# Altium schematic symbol library jlcpcb_2025_04_capacitors_extended_1206.schlib: 2503 symbols (part 11 of 14) (continued)
## GRM31CR70J226KE19L
designator C?  Capacitance: 22uF  (hidden comment: *)
Capacitor, Ceramic (MLCC), 22uF, ±10%, 6.3V, X7R, ±10%, SMD 1206; Manufacturer: Murata Electronics; Manufacturer Part Number: GRM31CR70J226KE19L; Package Size: 1206; JLCPCB Basic Part: No; JLCPCB Part Number: C408152; Supplier 1: LCSC; Category: Capacitors - MLCC; Supplier Part Number 1: C408152; Tolerance: ±10%; Voltage Rating: 6.3V; Temperature Coefficient: X7R; RoHS: Yes; ComponentLink1Description: Datasheet; ComponentLink1URL: https://wmsc.lcsc.com/wmsc/upload/file/pdf/v2/lcsc/2304140030_Murata-Electronics-GRM31CR70J226KE19L_C408152.pdf; ComponentLink2Description: JLCPCB Part URL; ComponentLink2URL: https://jlcpcb.com/partdetail/C408152; ComponentLink3Description: LCSC Part URL; ComponentLink3URL: https://lcsc.com/product-detail/Multilayer-Ceramic-Capacitors-MLCC---SMD-SMT_Murata-Electronics-Murata-Electronics-GRM31CR70J226KE19L_C408152.html
footprint CAP-1206 (1206 (3216M) Capacitor)
pins: 1, 2

## GRM31CR70J226ME19L
designator C?  Capacitance: 22uF  (hidden comment: *)
Capacitor, Ceramic (MLCC), 22uF, ±20%, 6.3V, X7R, ±20%, SMD 1206; Manufacturer: Murata Electronics; Manufacturer Part Number: GRM31CR70J226ME19L; Package Size: 1206; JLCPCB Basic Part: No; JLCPCB Part Number: C703095; Supplier 1: LCSC; Category: Capacitors - MLCC; Supplier Part Number 1: C703095; Tolerance: ±20%; Voltage Rating: 6.3V; Temperature Coefficient: X7R; RoHS: Yes; ComponentLink1Description: Datasheet; ComponentLink1URL: https://wmsc.lcsc.com/wmsc/upload/file/pdf/v2/lcsc/2304140030_Murata-Electronics-GRM31CR70J226ME19L_C703095.pdf; ComponentLink2Description: JLCPCB Part URL; ComponentLink2URL: https://jlcpcb.com/partdetail/C703095; ComponentLink3Description: LCSC Part URL; ComponentLink3URL: https://lcsc.com/product-detail/Multilayer-Ceramic-Capacitors-MLCC---SMD-SMT_Murata-Electronics-Murata-Electronics-GRM31CR70J226ME19L_C703095.html
footprint CAP-1206 (1206 (3216M) Capacitor)
pins: 1, 2

## GRM31CR71A106KA01L
designator C?  Capacitance: 10uF  (hidden comment: *)
Capacitor, Ceramic (MLCC), 10uF, ±10%, 10V, X7R, ±10%, SMD 1206; Manufacturer: Murata Electronics; Manufacturer Part Number: GRM31CR71A106KA01L; Package Size: 1206; JLCPCB Basic Part: No; JLCPCB Part Number: C97953; Supplier 1: LCSC; Category: Capacitors - MLCC; Supplier Part Number 1: C97953; Tolerance: ±10%; Voltage Rating: 10V; Temperature Coefficient: X7R; RoHS: Yes; ComponentLink1Description: Datasheet; ComponentLink1URL: https://wmsc.lcsc.com/wmsc/upload/file/pdf/v2/lcsc/2304140030_Murata-Electronics-GRM31CR71A106KA01L_C97953.pdf; ComponentLink2Description: JLCPCB Part URL; ComponentLink2URL: https://jlcpcb.com/partdetail/C97953; ComponentLink3Description: LCSC Part URL; ComponentLink3URL: https://lcsc.com/product-detail/Multilayer-Ceramic-Capacitors-MLCC---SMD-SMT_Murata-Electronics-Murata-Electronics-GRM31CR71A106KA01L_C97953.html
footprint CAP-1206 (1206 (3216M) Capacitor)
pins: 1, 2

## GRM31CR71A226KE15L
designator C?  Capacitance: 22uF  (hidden comment: *)
Capacitor, Ceramic (MLCC), 22uF, ±10%, 10V, X7R, ±10%, SMD 1206; Manufacturer: Murata Electronics; Manufacturer Part Number: GRM31CR71A226KE15L; Package Size: 1206; JLCPCB Basic Part: No; JLCPCB Part Number: C91604; Supplier 1: LCSC; Category: Capacitors - MLCC; Supplier Part Number 1: C91604; Tolerance: ±10%; Voltage Rating: 10V; Temperature Coefficient: X7R; RoHS: Yes; ComponentLink1Description: Datasheet; ComponentLink1URL: https://wmsc.lcsc.com/wmsc/upload/file/pdf/v2/lcsc/2304140030_Murata-Electronics-GRM31CR71A226KE15L_C91604.pdf; ComponentLink2Description: JLCPCB Part URL; ComponentLink2URL: https://jlcpcb.com/partdetail/C91604; ComponentLink3Description: LCSC Part URL; ComponentLink3URL: https://lcsc.com/product-detail/Multilayer-Ceramic-Capacitors-MLCC---SMD-SMT_Murata-Electronics-Murata-Electronics-GRM31CR71A226KE15L_C91604.html
footprint CAP-1206 (1206 (3216M) Capacitor)
pins: 1, 2

## GRM31CR71A226ME15L
designator C?  Capacitance: 22uF  (hidden comment: *)
Capacitor, Ceramic (MLCC), 22uF, ±20%, 10V, X7R, ±20%, SMD 1206; Manufacturer: Murata Electronics; Manufacturer Part Number: GRM31CR71A226ME15L; Package Size: 1206; JLCPCB Basic Part: No; JLCPCB Part Number: C162492; Supplier 1: LCSC; Category: Capacitors - MLCC; Supplier Part Number 1: C162492; Tolerance: ±20%; Voltage Rating: 10V; Temperature Coefficient: X7R; RoHS: Yes; ComponentLink1Description: Datasheet; ComponentLink1URL: https://wmsc.lcsc.com/wmsc/upload/file/pdf/v2/lcsc/2304140030_Murata-Electronics-GRM31CR71A226ME15L_C162492.pdf; ComponentLink2Description: JLCPCB Part URL; ComponentLink2URL: https://jlcpcb.com/partdetail/C162492; ComponentLink3Description: LCSC Part URL; ComponentLink3URL: https://lcsc.com/product-detail/Multilayer-Ceramic-Capacitors-MLCC---SMD-SMT_Murata-Electronics-Murata-Electronics-GRM31CR71A226ME15L_C162492.html
footprint CAP-1206 (1206 (3216M) Capacitor)
pins: 1, 2

## GRM31CR71C106KA12L
designator C?  Capacitance: 10uF  (hidden comment: *)
Capacitor, Ceramic (MLCC), 10uF, ±10%, 16V, X7R, ±10%, SMD 1206; Manufacturer: Murata Electronics; Manufacturer Part Number: GRM31CR71C106KA12L; Package Size: 1206; JLCPCB Basic Part: No; JLCPCB Part Number: C97954; Supplier 1: LCSC; Category: Capacitors - MLCC; Supplier Part Number 1: C97954; Tolerance: ±10%; Voltage Rating: 16V; Temperature Coefficient: X7R; RoHS: Yes; ComponentLink1Description: Datasheet; ComponentLink1URL: https://wmsc.lcsc.com/wmsc/upload/file/pdf/v2/lcsc/1810201308_Murata-Electronics-GRM31CR71C106KA12L_C97954.pdf; ComponentLink2Description: JLCPCB Part URL; ComponentLink2URL: https://jlcpcb.com/partdetail/C97954; ComponentLink3Description: LCSC Part URL; ComponentLink3URL: https://lcsc.com/product-detail/Multilayer-Ceramic-Capacitors-MLCC---SMD-SMT_Murata-Electronics-Murata-Electronics-GRM31CR71C106KA12L_C97954.html
footprint CAP-1206 (1206 (3216M) Capacitor)
pins: 1, 2

## GRM31CR71C475KA01L
designator C?  Capacitance: 4.7uF  (hidden comment: *)
Capacitor, Ceramic (MLCC), 4.7uF, ±10%, ±10%, SMD 1206; Manufacturer: Murata Electronics; Manufacturer Part Number: GRM31CR71C475KA01L; Package Size: 1206; JLCPCB Basic Part: No; JLCPCB Part Number: C97955; Supplier 1: LCSC; Category: Capacitors - MLCC; Supplier Part Number 1: C97955; Tolerance: ±10%; RoHS: Yes; ComponentLink1Description: Datasheet; ComponentLink1URL: https://wmsc.lcsc.com/wmsc/upload/file/pdf/v2/lcsc/2011191404_Murata-Electronics-GRM31CR71C475KA01L_C97955.pdf; ComponentLink2Description: JLCPCB Part URL; ComponentLink2URL: https://jlcpcb.com/partdetail/C97955; ComponentLink3Description: LCSC Part URL; ComponentLink3URL: https://lcsc.com/product-detail/Multilayer-Ceramic-Capacitors-MLCC---SMD-SMT_Murata-Electronics-Murata-Electronics-GRM31CR71C475KA01L_C97955.html
footprint CAP-1206 (1206 (3216M) Capacitor)
pins: 1, 2

## GRM31CR71E106KA12K
designator C?  Capacitance: 10uF  (hidden comment: *)
Capacitor, Ceramic (MLCC), 10uF, ±10%, 25V, X7R, ±10%, SMD 1206; Manufacturer: Murata Electronics; Manufacturer Part Number: GRM31CR71E106KA12K; Package Size: 1206; JLCPCB Basic Part: No; JLCPCB Part Number: C882506; Supplier 1: LCSC; Category: Capacitors - MLCC; Supplier Part Number 1: C882506; Tolerance: ±10%; Voltage Rating: 25V; Temperature Coefficient: X7R; RoHS: Yes; ComponentLink1Description: Datasheet; ComponentLink1URL: https://wmsc.lcsc.com/wmsc/upload/file/pdf/v2/lcsc/2201242130_Murata-Electronics-GRM31CR71E106KA12K_C882506.pdf; ComponentLink2Description: JLCPCB Part URL; ComponentLink2URL: https://jlcpcb.com/partdetail/C882506; ComponentLink3Description: LCSC Part URL; ComponentLink3URL: https://lcsc.com/product-detail/Multilayer-Ceramic-Capacitors-MLCC---SMD-SMT_Murata-Electronics-Murata-Electronics-GRM31CR71E106KA12K_C882506.html
footprint CAP-1206 (1206 (3216M) Capacitor)
pins: 1, 2

## GRM31CR71E106KA12L
designator C?  Capacitance: 10uF  (hidden comment: *)
Capacitor, Ceramic (MLCC), 10uF, ±10%, 25V, X7R, ±10%, SMD 1206; Manufacturer: Murata Electronics; Manufacturer Part Number: GRM31CR71E106KA12L; Package Size: 1206; JLCPCB Basic Part: No; JLCPCB Part Number: C77093; Supplier 1: LCSC; Category: Capacitors - MLCC; Supplier Part Number 1: C77093; Tolerance: ±10%; Voltage Rating: 25V; Temperature Coefficient: X7R; RoHS: Yes; ComponentLink1Description: Datasheet; ComponentLink1URL: https://wmsc.lcsc.com/wmsc/upload/file/pdf/v2/lcsc/2304140030_Murata-Electronics-GRM31CR71E106KA12L_C77093.pdf; ComponentLink2Description: JLCPCB Part URL; ComponentLink2URL: https://jlcpcb.com/partdetail/C77093; ComponentLink3Description: LCSC Part URL; ComponentLink3URL: https://lcsc.com/product-detail/Multilayer-Ceramic-Capacitors-MLCC---SMD-SMT_Murata-Electronics-Murata-Electronics-GRM31CR71E106KA12L_C77093.html
footprint CAP-1206 (1206 (3216M) Capacitor)
pins: 1, 2

## GRM31CR71E106KA41L
designator C?  Capacitance: 10uF  (hidden comment: *)
Capacitor, Ceramic (MLCC), 10uF, ±10%, 25V, X7R, ±10%, SMD 1206; Manufacturer: Murata Electronics; Manufacturer Part Number: GRM31CR71E106KA41L; Package Size: 1206; JLCPCB Basic Part: No; JLCPCB Part Number: C469549; Supplier 1: LCSC; Category: Capacitors - MLCC; Supplier Part Number 1: C469549; Tolerance: ±10%; Voltage Rating: 25V; Temperature Coefficient: X7R; RoHS: Yes; ComponentLink1Description: Datasheet; ComponentLink1URL: https://wmsc.lcsc.com/wmsc/upload/file/pdf/v2/lcsc/2304140030_Murata-Electronics-GRM31CR71E106KA41L_C469549.pdf; ComponentLink2Description: JLCPCB Part URL; ComponentLink2URL: https://jlcpcb.com/partdetail/C469549; ComponentLink3Description: LCSC Part URL; ComponentLink3URL: https://lcsc.com/product-detail/Multilayer-Ceramic-Capacitors-MLCC---SMD-SMT_Murata-Electronics-Murata-Electronics-GRM31CR71E106KA41L_C469549.html
footprint CAP-1206 (1206 (3216M) Capacitor)
pins: 1, 2

## GRM31CR71E106MA12L
designator C?  Capacitance: 10uF  (hidden comment: *)
Capacitor, Ceramic (MLCC), 10uF, ±20%, 25V, X7R, ±20%, SMD 1206; Manufacturer: Murata Electronics; Manufacturer Part Number: GRM31CR71E106MA12L; Package Size: 1206; JLCPCB Basic Part: No; JLCPCB Part Number: C440205; Supplier 1: LCSC; Category: Capacitors - MLCC; Supplier Part Number 1: C440205; Tolerance: ±20%; Voltage Rating: 25V; Temperature Coefficient: X7R; RoHS: Yes; ComponentLink1Description: Datasheet; ComponentLink1URL: https://wmsc.lcsc.com/wmsc/upload/file/pdf/v2/lcsc/2304140030_Murata-Electronics-GRM31CR71E106MA12L_C440205.pdf; ComponentLink2Description: JLCPCB Part URL; ComponentLink2URL: https://jlcpcb.com/partdetail/C440205; ComponentLink3Description: LCSC Part URL; ComponentLink3URL: https://lcsc.com/product-detail/Multilayer-Ceramic-Capacitors-MLCC---SMD-SMT_Murata-Electronics-Murata-Electronics-GRM31CR71E106MA12L_C440205.html
footprint CAP-1206 (1206 (3216M) Capacitor)
pins: 1, 2

## GRM31CR71E335KA88L
designator C?  Capacitance: 3.3uF  (hidden comment: *)
Capacitor, Ceramic (MLCC), 3.3uF, ±10%, 25V, X7R, ±10%, SMD 1206; Manufacturer: Murata Electronics; Manufacturer Part Number: GRM31CR71E335KA88L; Package Size: 1206; JLCPCB Basic Part: No; JLCPCB Part Number: C668366; Supplier 1: LCSC; Category: Capacitors - MLCC; Supplier Part Number 1: C668366; Tolerance: ±10%; Voltage Rating: 25V; Temperature Coefficient: X7R; RoHS: Yes; ComponentLink1Description: Datasheet; ComponentLink1URL: https://wmsc.lcsc.com/wmsc/upload/file/pdf/v2/lcsc/2308111643_Murata-Electronics-GRM31CR71E335KA88L_C668366.pdf; ComponentLink2Description: JLCPCB Part URL; ComponentLink2URL: https://jlcpcb.com/partdetail/C668366; ComponentLink3Description: LCSC Part URL; ComponentLink3URL: https://lcsc.com/product-detail/Multilayer-Ceramic-Capacitors-MLCC---SMD-SMT_Murata-Electronics-Murata-Electronics-GRM31CR71E335KA88L_C668366.html
footprint CAP-1206 (1206 (3216M) Capacitor)
pins: 1, 2

## GRM31CR71E475KA88L
designator C?  Capacitance: 4.7uF  (hidden comment: *)
Capacitor, Ceramic (MLCC), 4.7uF, ±10%, 25V, X7R, ±10%, SMD 1206; Manufacturer: Murata Electronics; Manufacturer Part Number: GRM31CR71E475KA88L; Package Size: 1206; JLCPCB Basic Part: No; JLCPCB Part Number: C77094; Supplier 1: LCSC; Category: Capacitors - MLCC; Supplier Part Number 1: C77094; Tolerance: ±10%; Voltage Rating: 25V; Temperature Coefficient: X7R; RoHS: Yes; ComponentLink1Description: Datasheet; ComponentLink1URL: https://wmsc.lcsc.com/wmsc/upload/file/pdf/v2/lcsc/2304140030_Murata-Electronics-GRM31CR71E475KA88L_C77094.pdf; ComponentLink2Description: JLCPCB Part URL; ComponentLink2URL: https://jlcpcb.com/partdetail/C77094; ComponentLink3Description: LCSC Part URL; ComponentLink3URL: https://lcsc.com/product-detail/Multilayer-Ceramic-Capacitors-MLCC---SMD-SMT_Murata-Electronics-Murata-Electronics-GRM31CR71E475KA88L_C77094.html
footprint CAP-1206 (1206 (3216M) Capacitor)
pins: 1, 2

## GRM31CR71H225KA88L
designator C?  Capacitance: 2.2uF  (hidden comment: *)
Capacitor, Ceramic (MLCC), 2.2uF, ±10%, 50V, X7R, ±10%, SMD 1206; Manufacturer: Murata Electronics; Manufacturer Part Number: GRM31CR71H225KA88L; Package Size: 1206; JLCPCB Basic Part: No; JLCPCB Part Number: C77095; Supplier 1: LCSC; Category: Capacitors - MLCC; Supplier Part Number 1: C77095; Tolerance: ±10%; Voltage Rating: 50V; Temperature Coefficient: X7R; RoHS: Yes; ComponentLink1Description: Datasheet; ComponentLink1URL: https://wmsc.lcsc.com/wmsc/upload/file/pdf/v2/lcsc/2304140030_Murata-Electronics-GRM31CR71H225KA88L_C77095.pdf; ComponentLink2Description: JLCPCB Part URL; ComponentLink2URL: https://jlcpcb.com/partdetail/C77095; ComponentLink3Description: LCSC Part URL; ComponentLink3URL: https://lcsc.com/product-detail/Multilayer-Ceramic-Capacitors-MLCC---SMD-SMT_Murata-Electronics-Murata-Electronics-GRM31CR71H225KA88L_C77095.html
footprint CAP-1206 (1206 (3216M) Capacitor)
pins: 1, 2

## GRM31CR71H475KA12L
designator C?  Capacitance: 4.7uF  (hidden comment: *)
Capacitor, Ceramic (MLCC), 4.7uF, ±10%, 50V, X7R, ±10%, SMD 1206; Manufacturer: Murata Electronics; Manufacturer Part Number: GRM31CR71H475KA12L; Package Size: 1206; JLCPCB Basic Part: No; JLCPCB Part Number: C77096; Supplier 1: LCSC; Category: Capacitors - MLCC; Supplier Part Number 1: C77096; Tolerance: ±10%; Voltage Rating: 50V; Temperature Coefficient: X7R; RoHS: Yes; ComponentLink1Description: Datasheet; ComponentLink1URL: https://wmsc.lcsc.com/wmsc/upload/file/pdf/v2/lcsc/2304140030_Murata-Electronics-GRM31CR71H475KA12L_C77096.pdf; ComponentLink2Description: JLCPCB Part URL; ComponentLink2URL: https://jlcpcb.com/partdetail/C77096; ComponentLink3Description: LCSC Part URL; ComponentLink3URL: https://lcsc.com/product-detail/Multilayer-Ceramic-Capacitors-MLCC---SMD-SMT_Murata-Electronics-Murata-Electronics-GRM31CR71H475KA12L_C77096.html
footprint CAP-1206 (1206 (3216M) Capacitor)
pins: 1, 2

## GRM31CR72A105KA01K
designator C?  Capacitance: 1uF  (hidden comment: *)
Capacitor, Ceramic (MLCC), 1uF, ±10%, 100V, X7R, ±10%, SMD 1206; Manufacturer: Murata Electronics; Manufacturer Part Number: GRM31CR72A105KA01K; Package Size: 1206; JLCPCB Basic Part: No; JLCPCB Part Number: C909823; Supplier 1: LCSC; Category: Capacitors - MLCC; Supplier Part Number 1: C909823; Tolerance: ±10%; Voltage Rating: 100V; Temperature Coefficient: X7R; RoHS: Yes; ComponentLink1Description: Datasheet; ComponentLink1URL: https://wmsc.lcsc.com/wmsc/upload/file/pdf/v2/lcsc/2304140030_Murata-Electronics-GRM31CR72A105KA01K_C909823.pdf; ComponentLink2Description: JLCPCB Part URL; ComponentLink2URL: https://jlcpcb.com/partdetail/C909823; ComponentLink3Description: LCSC Part URL; ComponentLink3URL: https://lcsc.com/product-detail/Multilayer-Ceramic-Capacitors-MLCC---SMD-SMT_Murata-Electronics-Murata-Electronics-GRM31CR72A105KA01K_C909823.html
footprint CAP-1206 (1206 (3216M) Capacitor)
pins: 1, 2

## GRM31CR72A225KA73K
designator C?  Capacitance: 2.2uF  (hidden comment: *)
Capacitor, Ceramic (MLCC), 2.2uF, ±10%, ±10%, SMD 1206; Manufacturer: Murata Electronics; Manufacturer Part Number: GRM31CR72A225KA73K; Package Size: 1206; JLCPCB Basic Part: No; JLCPCB Part Number: C909824; Supplier 1: LCSC; Category: Capacitors - MLCC; Supplier Part Number 1: C909824; Tolerance: ±10%; RoHS: Yes; ComponentLink1Description: Datasheet; ComponentLink1URL: https://wmsc.lcsc.com/wmsc/upload/file/pdf/v2/lcsc/2304140030_Murata-Electronics-GRM31CR72A225KA73K_C909824.pdf; ComponentLink2Description: JLCPCB Part URL; ComponentLink2URL: https://jlcpcb.com/partdetail/C909824; ComponentLink3Description: LCSC Part URL; ComponentLink3URL: https://lcsc.com/product-detail/Multilayer-Ceramic-Capacitors-MLCC---SMD-SMT_Murata-Electronics-Murata-Electronics-GRM31CR72A225KA73K_C909824.html
footprint CAP-1206 (1206 (3216M) Capacitor)
pins: 1, 2

## GRM31CR72A225KA73L
designator C?  Capacitance: 2.2uF  (hidden comment: *)
Capacitor, Ceramic (MLCC), 2.2uF, ±10%, ±10%, SMD 1206; Manufacturer: Murata Electronics; Manufacturer Part Number: GRM31CR72A225KA73L; Package Size: 1206; JLCPCB Basic Part: No; JLCPCB Part Number: C913599; Supplier 1: LCSC; Category: Capacitors - MLCC; Supplier Part Number 1: C913599; Tolerance: ±10%; RoHS: Yes; ComponentLink1Description: Datasheet; ComponentLink1URL: https://wmsc.lcsc.com/wmsc/upload/file/pdf/v2/lcsc/2011151633_Murata-Electronics-GRM31CR72A225KA73L_C913599.pdf; ComponentLink2Description: JLCPCB Part URL; ComponentLink2URL: https://jlcpcb.com/partdetail/C913599; ComponentLink3Description: LCSC Part URL; ComponentLink3URL: https://lcsc.com/product-detail/Multilayer-Ceramic-Capacitors-MLCC---SMD-SMT_Murata-Electronics-Murata-Electronics-GRM31CR72A225KA73L_C913599.html
footprint CAP-1206 (1206 (3216M) Capacitor)
pins: 1, 2

## GRM31CR72D104KW03L
designator C?  Capacitance: 100nF  (hidden comment: *)
Capacitor, Ceramic (MLCC), 100nF, ±10%, 200V, X7R, ±10%, SMD 1206; Manufacturer: Murata Electronics; Manufacturer Part Number: GRM31CR72D104KW03L; Package Size: 1206; JLCPCB Basic Part: No; JLCPCB Part Number: C162496; Supplier 1: LCSC; Category: Capacitors - MLCC; Supplier Part Number 1: C162496; Tolerance: ±10%; Voltage Rating: 200V; Temperature Coefficient: X7R; RoHS: Yes; ComponentLink1Description: Datasheet; ComponentLink1URL: https://wmsc.lcsc.com/wmsc/upload/file/pdf/v2/lcsc/1810201234_Murata-Electronics-GRM31CR72D104KW03L_C162496.pdf; ComponentLink2Description: JLCPCB Part URL; ComponentLink2URL: https://jlcpcb.com/partdetail/C162496; ComponentLink3Description: LCSC Part URL; ComponentLink3URL: https://lcsc.com/product-detail/Multilayer-Ceramic-Capacitors-MLCC---SMD-SMT_Murata-Electronics-Murata-Electronics-GRM31CR72D104KW03L_C162496.html
footprint CAP-1206 (1206 (3216M) Capacitor)
pins: 1, 2

## GRM31CR72E104KW03L
designator C?  Capacitance: 100nF  (hidden comment: *)
Capacitor, Ceramic (MLCC), 100nF, ±10%, 250V, X7R, ±10%, SMD 1206; Manufacturer: Murata Electronics; Manufacturer Part Number: GRM31CR72E104KW03L; Package Size: 1206; JLCPCB Basic Part: No; JLCPCB Part Number: C97956; Supplier 1: LCSC; Category: Capacitors - MLCC; Supplier Part Number 1: C97956; Tolerance: ±10%; Voltage Rating: 250V; Temperature Coefficient: X7R; RoHS: Yes; ComponentLink1Description: Datasheet; ComponentLink1URL: https://wmsc.lcsc.com/wmsc/upload/file/pdf/v2/lcsc/1810201314_Murata-Electronics-GRM31CR72E104KW03L_C97956.pdf; ComponentLink2Description: JLCPCB Part URL; ComponentLink2URL: https://jlcpcb.com/partdetail/C97956; ComponentLink3Description: LCSC Part URL; ComponentLink3URL: https://lcsc.com/product-detail/Multilayer-Ceramic-Capacitors-MLCC---SMD-SMT_Murata-Electronics-Murata-Electronics-GRM31CR72E104KW03L_C97956.html
footprint CAP-1206 (1206 (3216M) Capacitor)
pins: 1, 2

## GRM31CR72E333KW03L
designator C?  Capacitance: 33nF  (hidden comment: *)
Capacitor, Ceramic (MLCC), 33nF, ±10%, 250V, X7R, ±10%, SMD 1206; Manufacturer: Murata Electronics; Manufacturer Part Number: GRM31CR72E333KW03L; Package Size: 1206; JLCPCB Basic Part: No; JLCPCB Part Number: C97957; Supplier 1: LCSC; Category: Capacitors - MLCC; Supplier Part Number 1: C97957; Tolerance: ±10%; Voltage Rating: 250V; Temperature Coefficient: X7R; RoHS: Yes; ComponentLink1Description: Datasheet; ComponentLink1URL: https://wmsc.lcsc.com/wmsc/upload/file/pdf/v2/lcsc/1810201220_Murata-Electronics-GRM31CR72E333KW03L_C97957.pdf; ComponentLink2Description: JLCPCB Part URL; ComponentLink2URL: https://jlcpcb.com/partdetail/C97957; ComponentLink3Description: LCSC Part URL; ComponentLink3URL: https://lcsc.com/product-detail/Multilayer-Ceramic-Capacitors-MLCC---SMD-SMT_Murata-Electronics-Murata-Electronics-GRM31CR72E333KW03L_C97957.html
footprint CAP-1206 (1206 (3216M) Capacitor)
pins: 1, 2

## GRM31CR72E473KW03L
designator C?  Capacitance: 47nF  (hidden comment: *)
Capacitor, Ceramic (MLCC), 47nF, ±10%, 250V, X7R, ±10%, SMD 1206; Manufacturer: Murata Electronics; Manufacturer Part Number: GRM31CR72E473KW03L; Package Size: 1206; JLCPCB Basic Part: No; JLCPCB Part Number: C97958; Supplier 1: LCSC; Category: Capacitors - MLCC; Supplier Part Number 1: C97958; Tolerance: ±10%; Voltage Rating: 250V; Temperature Coefficient: X7R; RoHS: Yes; ComponentLink1Description: Datasheet; ComponentLink1URL: https://wmsc.lcsc.com/wmsc/upload/file/pdf/v2/lcsc/1810201249_Murata-Electronics-GRM31CR72E473KW03L_C97958.pdf; ComponentLink2Description: JLCPCB Part URL; ComponentLink2URL: https://jlcpcb.com/partdetail/C97958; ComponentLink3Description: LCSC Part URL; ComponentLink3URL: https://lcsc.com/product-detail/Multilayer-Ceramic-Capacitors-MLCC---SMD-SMT_Murata-Electronics-Murata-Electronics-GRM31CR72E473KW03L_C97958.html
footprint CAP-1206 (1206 (3216M) Capacitor)
pins: 1, 2

## GRM31CR72J153KW03L
designator C?  Capacitance: 15nF  (hidden comment: *)
Capacitor, Ceramic (MLCC), 15nF, ±10%, 630V, X7R, ±10%, SMD 1206; Manufacturer: Murata Electronics; Manufacturer Part Number: GRM31CR72J153KW03L; Package Size: 1206; JLCPCB Basic Part: No; JLCPCB Part Number: C97959; Supplier 1: LCSC; Category: Capacitors - MLCC; Supplier Part Number 1: C97959; Tolerance: ±10%; Voltage Rating: 630V; Temperature Coefficient: X7R; RoHS: Yes; ComponentLink1Description: Datasheet; ComponentLink1URL: https://wmsc.lcsc.com/wmsc/upload/file/pdf/v2/lcsc/1810201249_Murata-Electronics-GRM31CR72J153KW03L_C97959.pdf; ComponentLink2Description: JLCPCB Part URL; ComponentLink2URL: https://jlcpcb.com/partdetail/C97959; ComponentLink3Description: LCSC Part URL; ComponentLink3URL: https://lcsc.com/product-detail/Multilayer-Ceramic-Capacitors-MLCC---SMD-SMT_Murata-Electronics-Murata-Electronics-GRM31CR72J153KW03L_C97959.html
footprint CAP-1206 (1206 (3216M) Capacitor)
pins: 1, 2

## GRM31CR72J223KW03L
designator C?  Capacitance: 22nF  (hidden comment: *)
Capacitor, Ceramic (MLCC), 22nF, ±10%, 630V, X7R, ±10%, SMD 1206; Manufacturer: Murata Electronics; Manufacturer Part Number: GRM31CR72J223KW03L; Package Size: 1206; JLCPCB Basic Part: No; JLCPCB Part Number: C162497; Supplier 1: LCSC; Category: Capacitors - MLCC; Supplier Part Number 1: C162497; Tolerance: ±10%; Voltage Rating: 630V; Temperature Coefficient: X7R; RoHS: Yes; ComponentLink1Description: Datasheet; ComponentLink1URL: https://wmsc.lcsc.com/wmsc/upload/file/pdf/v2/lcsc/1810201241_Murata-Electronics-GRM31CR72J223KW03L_C162497.pdf; ComponentLink2Description: JLCPCB Part URL; ComponentLink2URL: https://jlcpcb.com/partdetail/C162497; ComponentLink3Description: LCSC Part URL; ComponentLink3URL: https://lcsc.com/product-detail/Multilayer-Ceramic-Capacitors-MLCC---SMD-SMT_Murata-Electronics-Murata-Electronics-GRM31CR72J223KW03L_C162497.html
footprint CAP-1206 (1206 (3216M) Capacitor)
pins: 1, 2

## GRM31CR73A103KW03L
designator C?  Capacitance: 10nF  (hidden comment: *)
Capacitor, Ceramic (MLCC), 10nF, ±10%, 1kV, X7R, ±10%, SMD 1206; Manufacturer: Murata Electronics; Manufacturer Part Number: GRM31CR73A103KW03L; Package Size: 1206; JLCPCB Basic Part: No; JLCPCB Part Number: C77098; Supplier 1: LCSC; Category: Capacitors - MLCC; Supplier Part Number 1: C77098; Tolerance: ±10%; Voltage Rating: 1kV; Temperature Coefficient: X7R; RoHS: Yes; ComponentLink1Description: Datasheet; ComponentLink1URL: https://wmsc.lcsc.com/wmsc/upload/file/pdf/v2/lcsc/2304140030_Murata-Electronics-GRM31CR73A103KW03L_C77098.pdf; ComponentLink2Description: JLCPCB Part URL; ComponentLink2URL: https://jlcpcb.com/partdetail/C77098; ComponentLink3Description: LCSC Part URL; ComponentLink3URL: https://lcsc.com/product-detail/Multilayer-Ceramic-Capacitors-MLCC---SMD-SMT_Murata-Electronics-Murata-Electronics-GRM31CR73A103KW03L_C77098.html
footprint CAP-1206 (1206 (3216M) Capacitor)
pins: 1, 2

## GRM31CZ71C226ME15L
designator C?  Capacitance: 22uF  (hidden comment: *)
Capacitor, Ceramic (MLCC), 22uF, ±20%, 16V, X7R, ±20%, SMD 1206; Manufacturer: Murata Electronics; Manufacturer Part Number: GRM31CZ71C226ME15L; Package Size: 1206; JLCPCB Basic Part: No; JLCPCB Part Number: C909845; Supplier 1: LCSC; Category: Capacitors - MLCC; Supplier Part Number 1: C909845; Tolerance: ±20%; Voltage Rating: 16V; Temperature Coefficient: X7R; RoHS: Yes; ComponentLink1Description: Datasheet; ComponentLink1URL: https://wmsc.lcsc.com/wmsc/upload/file/pdf/v2/lcsc/2304140030_Murata-Electronics-GRM31CZ71C226ME15L_C909845.pdf; ComponentLink2Description: JLCPCB Part URL; ComponentLink2URL: https://jlcpcb.com/partdetail/C909845; ComponentLink3Description: LCSC Part URL; ComponentLink3URL: https://lcsc.com/product-detail/Multilayer-Ceramic-Capacitors-MLCC---SMD-SMT_Murata-Electronics-Murata-Electronics-GRM31CZ71C226ME15L_C909845.html
footprint CAP-1206 (1206 (3216M) Capacitor)
pins: 1, 2

## GRM31CZ72A475KE11L
designator C?  Capacitance: 4.7uF  (hidden comment: *)
Capacitor, Ceramic (MLCC), 4.7uF, ±10%, 100V, X7R, ±10%, SMD 1206; Manufacturer: Murata Electronics; Manufacturer Part Number: GRM31CZ72A475KE11L; Package Size: 1206; JLCPCB Basic Part: No; JLCPCB Part Number: C2997285; Supplier 1: LCSC; Category: Capacitors - MLCC; Supplier Part Number 1: C2997285; Tolerance: ±10%; Voltage Rating: 100V; Temperature Coefficient: X7R; RoHS: Yes; ComponentLink1Description: Datasheet; ComponentLink1URL: https://wmsc.lcsc.com/wmsc/upload/file/pdf/v2/lcsc/2208291730_Murata-Electronics-GRM31CZ72A475KE11L_C2997285.pdf; ComponentLink2Description: JLCPCB Part URL; ComponentLink2URL: https://jlcpcb.com/partdetail/C2997285; ComponentLink3Description: LCSC Part URL; ComponentLink3URL: https://lcsc.com/product-detail/Multilayer-Ceramic-Capacitors-MLCC---SMD-SMT_Murata-Electronics-Murata-Electronics-GRM31CZ72A475KE11L_C2997285.html
footprint CAP-1206 (1206 (3216M) Capacitor)
pins: 1, 2

## GRM31M5C1H393JA01L
designator C?  Capacitance: 39nF  (hidden comment: *)
Capacitor, Ceramic (MLCC), 39nF, ±5%, null, null, ±5%, SMD 1206; Manufacturer: Murata Electronics; Manufacturer Part Number: GRM31M5C1H393JA01L; Package Size: 1206; JLCPCB Basic Part: No; JLCPCB Part Number: C524625; Supplier 1: LCSC; Category: Capacitors - MLCC; Supplier Part Number 1: C524625; Tolerance: ±5%; Voltage Rating: null; Temperature Coefficient: null; RoHS: Yes; ComponentLink1Description: Datasheet; ComponentLink1URL: https://wmsc.lcsc.com/wmsc/upload/file/pdf/v2/lcsc/2304140030_Murata-Electronics-GRM31M5C1H393JA01L_C524625.pdf; ComponentLink2Description: JLCPCB Part URL; ComponentLink2URL: https://jlcpcb.com/partdetail/C524625; ComponentLink3Description: LCSC Part URL; ComponentLink3URL: https://lcsc.com/product-detail/Multilayer-Ceramic-Capacitors-MLCC---SMD-SMT_Murata-Electronics-Murata-Electronics-GRM31M5C1H393JA01L_C524625.html
footprint CAP-1206 (1206 (3216M) Capacitor)
pins: 1, 2

## GRM31M5C1H473JA01L
designator C?  Capacitance: 47nF  (hidden comment: *)
Capacitor, Ceramic (MLCC), 47nF, ±5%, 50V, C0G, ±5%, SMD 1206; Manufacturer: Murata Electronics; Manufacturer Part Number: GRM31M5C1H473JA01L; Package Size: 1206; JLCPCB Basic Part: No; JLCPCB Part Number: C21812; Supplier 1: LCSC; Category: Capacitors - MLCC; Supplier Part Number 1: C21812; Tolerance: ±5%; Voltage Rating: 50V; Temperature Coefficient: C0G; RoHS: Yes; ComponentLink1Description: Datasheet; ComponentLink1URL: https://wmsc.lcsc.com/wmsc/upload/file/pdf/v2/lcsc/1810201313_Murata-Electronics-GRM31M5C1H473JA01L_C21812.pdf; ComponentLink2Description: JLCPCB Part URL; ComponentLink2URL: https://jlcpcb.com/partdetail/C21812; ComponentLink3Description: LCSC Part URL; ComponentLink3URL: https://lcsc.com/product-detail/Multilayer-Ceramic-Capacitors-MLCC---SMD-SMT_Murata-Electronics-Murata-Electronics-GRM31M5C1H473JA01L_C21812.html
footprint CAP-1206 (1206 (3216M) Capacitor)
pins: 1, 2

## GRM31M7U1H104JA01L
designator C?  Capacitance: 100nF  (hidden comment: *)
Capacitor, Ceramic (MLCC), 100nF, ±5%, 50V, U2J, ±5%, SMD 1206; Manufacturer: Murata Electronics; Manufacturer Part Number: GRM31M7U1H104JA01L; Package Size: 1206; JLCPCB Basic Part: No; JLCPCB Part Number: C415383; Supplier 1: LCSC; Category: Capacitors - MLCC; Supplier Part Number 1: C415383; Tolerance: ±5%; Voltage Rating: 50V; Temperature Coefficient: U2J; RoHS: Yes; ComponentLink1Description: Datasheet; ComponentLink1URL: https://wmsc.lcsc.com/wmsc/upload/file/pdf/v2/lcsc/2304140030_Murata-Electronics-GRM31M7U1H104JA01L_C415383.pdf; ComponentLink2Description: JLCPCB Part URL; ComponentLink2URL: https://jlcpcb.com/partdetail/C415383; ComponentLink3Description: LCSC Part URL; ComponentLink3URL: https://lcsc.com/product-detail/Multilayer-Ceramic-Capacitors-MLCC---SMD-SMT_Murata-Electronics-Murata-Electronics-GRM31M7U1H104JA01L_C415383.html
footprint CAP-1206 (1206 (3216M) Capacitor)
pins: 1, 2

## GRM31MB31A106KE18L
designator C?  Capacitance: 10uF  (hidden comment: *)
Capacitor, Ceramic (MLCC), 10uF, ±10%, 10V, B, ±10%, SMD 1206; Manufacturer: Murata Electronics; Manufacturer Part Number: GRM31MB31A106KE18L; Package Size: 1206; JLCPCB Basic Part: No; JLCPCB Part Number: C162498; Supplier 1: LCSC; Category: Capacitors - MLCC; Supplier Part Number 1: C162498; Tolerance: ±10%; Voltage Rating: 10V; Temperature Coefficient: B; RoHS: Yes; ComponentLink1Description: Datasheet; ComponentLink1URL: https://wmsc.lcsc.com/wmsc/upload/file/pdf/v2/lcsc/2304140030_Murata-Electronics-GRM31MB31A106KE18L_C162498.pdf; ComponentLink2Description: JLCPCB Part URL; ComponentLink2URL: https://jlcpcb.com/partdetail/C162498; ComponentLink3Description: LCSC Part URL; ComponentLink3URL: https://lcsc.com/product-detail/Multilayer-Ceramic-Capacitors-MLCC---SMD-SMT_Murata-Electronics-Murata-Electronics-GRM31MB31A106KE18L_C162498.html
footprint CAP-1206 (1206 (3216M) Capacitor)
pins: 1, 2

## GRM31MR71C225KA35L
designator C?  Capacitance: 2.2uF  (hidden comment: *)
Capacitor, Ceramic (MLCC), 2.2uF, ±10%, 16V, X7R, ±10%, SMD 1206; Manufacturer: Murata Electronics; Manufacturer Part Number: GRM31MR71C225KA35L; Package Size: 1206; JLCPCB Basic Part: No; JLCPCB Part Number: C97960; Supplier 1: LCSC; Category: Capacitors - MLCC; Supplier Part Number 1: C97960; Tolerance: ±10%; Voltage Rating: 16V; Temperature Coefficient: X7R; RoHS: Yes; ComponentLink1Description: Datasheet; ComponentLink1URL: https://wmsc.lcsc.com/wmsc/upload/file/pdf/v2/lcsc/1810201248_Murata-Electronics-GRM31MR71C225KA35L_C97960.pdf; ComponentLink2Description: JLCPCB Part URL; ComponentLink2URL: https://jlcpcb.com/partdetail/C97960; ComponentLink3Description: LCSC Part URL; ComponentLink3URL: https://lcsc.com/product-detail/Multilayer-Ceramic-Capacitors-MLCC---SMD-SMT_Murata-Electronics-Murata-Electronics-GRM31MR71C225KA35L_C97960.html
footprint CAP-1206 (1206 (3216M) Capacitor)
pins: 1, 2

## GRM31MR71E225KA93L
designator C?  Capacitance: 2.2uF  (hidden comment: *)
Capacitor, Ceramic (MLCC), 2.2uF, ±10%, 25V, X7R, ±10%, SMD 1206; Manufacturer: Murata Electronics; Manufacturer Part Number: GRM31MR71E225KA93L; Package Size: 1206; JLCPCB Basic Part: No; JLCPCB Part Number: C97962; Supplier 1: LCSC; Category: Capacitors - MLCC; Supplier Part Number 1: C97962; Tolerance: ±10%; Voltage Rating: 25V; Temperature Coefficient: X7R; RoHS: Yes; ComponentLink1Description: Datasheet; ComponentLink1URL: https://wmsc.lcsc.com/wmsc/upload/file/pdf/v2/lcsc/1810201248_Murata-Electronics-GRM31MR71E225KA93L_C97962.pdf; ComponentLink2Description: JLCPCB Part URL; ComponentLink2URL: https://jlcpcb.com/partdetail/C97962; ComponentLink3Description: LCSC Part URL; ComponentLink3URL: https://lcsc.com/product-detail/Multilayer-Ceramic-Capacitors-MLCC---SMD-SMT_Murata-Electronics-Murata-Electronics-GRM31MR71E225KA93L_C97962.html
footprint CAP-1206 (1206 (3216M) Capacitor)
pins: 1, 2

## GRM31MR71H104KA01L
designator C?  Capacitance: 100nF  (hidden comment: *)
Capacitor, Ceramic (MLCC), 100nF, ±10%, ±10%, SMD 1206; Manufacturer: Murata Electronics; Manufacturer Part Number: GRM31MR71H104KA01L; Package Size: 1206; JLCPCB Basic Part: No; JLCPCB Part Number: C469550; Supplier 1: LCSC; Category: Capacitors - MLCC; Supplier Part Number 1: C469550; Tolerance: ±10%; RoHS: Yes; ComponentLink1Description: Datasheet; ComponentLink1URL: https://wmsc.lcsc.com/wmsc/upload/file/pdf/v2/lcsc/2304140030_Murata-Electronics-GRM31MR71H104KA01L_C469550.pdf; ComponentLink2Description: JLCPCB Part URL; ComponentLink2URL: https://jlcpcb.com/partdetail/C469550; ComponentLink3Description: LCSC Part URL; ComponentLink3URL: https://lcsc.com/product-detail/Multilayer-Ceramic-Capacitors-MLCC---SMD-SMT_Murata-Electronics-Murata-Electronics-GRM31MR71H104KA01L_C469550.html
footprint CAP-1206 (1206 (3216M) Capacitor)
pins: 1, 2

## GRM31MR71H105KA88L
designator C?  Capacitance: 1uF  (hidden comment: *)
Capacitor, Ceramic (MLCC), 1uF, ±10%, 50V, X7R, ±10%, SMD 1206; Manufacturer: Murata Electronics; Manufacturer Part Number: GRM31MR71H105KA88L; Package Size: 1206; JLCPCB Basic Part: No; JLCPCB Part Number: C77099; Supplier 1: LCSC; Category: Capacitors - MLCC; Supplier Part Number 1: C77099; Tolerance: ±10%; Voltage Rating: 50V; Temperature Coefficient: X7R; RoHS: Yes; ComponentLink1Description: Datasheet; ComponentLink1URL: https://wmsc.lcsc.com/wmsc/upload/file/pdf/v2/lcsc/2304140030_Murata-Electronics-GRM31MR71H105KA88L_C77099.pdf; ComponentLink2Description: JLCPCB Part URL; ComponentLink2URL: https://jlcpcb.com/partdetail/C77099; ComponentLink3Description: LCSC Part URL; ComponentLink3URL: https://lcsc.com/product-detail/Multilayer-Ceramic-Capacitors-MLCC---SMD-SMT_Murata-Electronics-Murata-Electronics-GRM31MR71H105KA88L_C77099.html
footprint CAP-1206 (1206 (3216M) Capacitor)
pins: 1, 2

## GRM31MR71H474KA01K
designator C?  Capacitance: 0.47pF  (hidden comment: *)
Capacitor, Ceramic (MLCC), 0.47pF, ±10%, 50V, X7R, ±10%, SMD 1206; Manufacturer: Murata Electronics; Manufacturer Part Number: GRM31MR71H474KA01K; Package Size: 1206; JLCPCB Basic Part: No; JLCPCB Part Number: C471384; Supplier 1: LCSC; Category: Capacitors - MLCC; Supplier Part Number 1: C471384; Tolerance: ±10%; Voltage Rating: 50V; Temperature Coefficient: X7R; RoHS: Yes; ComponentLink1Description: Datasheet; ComponentLink1URL: https://wmsc.lcsc.com/wmsc/upload/file/pdf/v2/lcsc/2001111409_Murata-Electronics-GRM31MR71H474KA01K_C471384.pdf; ComponentLink2Description: JLCPCB Part URL; ComponentLink2URL: https://jlcpcb.com/partdetail/C471384; ComponentLink3Description: LCSC Part URL; ComponentLink3URL: https://lcsc.com/product-detail/Multilayer-Ceramic-Capacitors-MLCC---SMD-SMT_Murata-Electronics-Murata-Electronics-GRM31MR71H474KA01K_C471384.html
footprint CAP-1206 (1206 (3216M) Capacitor)
pins: 1, 2

## GRM31MR71H474KA01L
designator C?  Capacitance: 470nF  (hidden comment: *)
Capacitor, Ceramic (MLCC), 470nF, ±10%, 50V, X7R, ±10%, SMD 1206; Manufacturer: Murata Electronics; Manufacturer Part Number: GRM31MR71H474KA01L; Package Size: 1206; JLCPCB Basic Part: No; JLCPCB Part Number: C97963; Supplier 1: LCSC; Category: Capacitors - MLCC; Supplier Part Number 1: C97963; Tolerance: ±10%; Voltage Rating: 50V; Temperature Coefficient: X7R; RoHS: Yes; ComponentLink1Description: Datasheet; ComponentLink1URL: https://wmsc.lcsc.com/wmsc/upload/file/pdf/v2/lcsc/1810201248_Murata-Electronics-GRM31MR71H474KA01L_C97963.pdf; ComponentLink2Description: JLCPCB Part URL; ComponentLink2URL: https://jlcpcb.com/partdetail/C97963; ComponentLink3Description: LCSC Part URL; ComponentLink3URL: https://lcsc.com/product-detail/Multilayer-Ceramic-Capacitors-MLCC---SMD-SMT_Murata-Electronics-Murata-Electronics-GRM31MR71H474KA01L_C97963.html
footprint CAP-1206 (1206 (3216M) Capacitor)
pins: 1, 2

## GRM31MR71H684KA88L
designator C?  Capacitance: 680nF  (hidden comment: *)
Capacitor, Ceramic (MLCC), 680nF, ±10%, null, X7R, ±10%, SMD 1206; Manufacturer: Murata Electronics; Manufacturer Part Number: GRM31MR71H684KA88L; Package Size: 1206; JLCPCB Basic Part: No; JLCPCB Part Number: C913621; Supplier 1: LCSC; Category: Capacitors - MLCC; Supplier Part Number 1: C913621; Tolerance: ±10%; Voltage Rating: null; Temperature Coefficient: X7R; RoHS: Yes; ComponentLink1Description: Datasheet; ComponentLink1URL: https://wmsc.lcsc.com/wmsc/upload/file/pdf/v2/lcsc/2201131300_Murata-Electronics-GRM31MR71H684KA88L_C913621.pdf; ComponentLink2Description: JLCPCB Part URL; ComponentLink2URL: https://jlcpcb.com/partdetail/C913621; ComponentLink3Description: LCSC Part URL; ComponentLink3URL: https://lcsc.com/product-detail/Multilayer-Ceramic-Capacitors-MLCC---SMD-SMT_Murata-Electronics-Murata-Electronics-GRM31MR71H684KA88L_C913621.html
footprint CAP-1206 (1206 (3216M) Capacitor)
pins: 1, 2

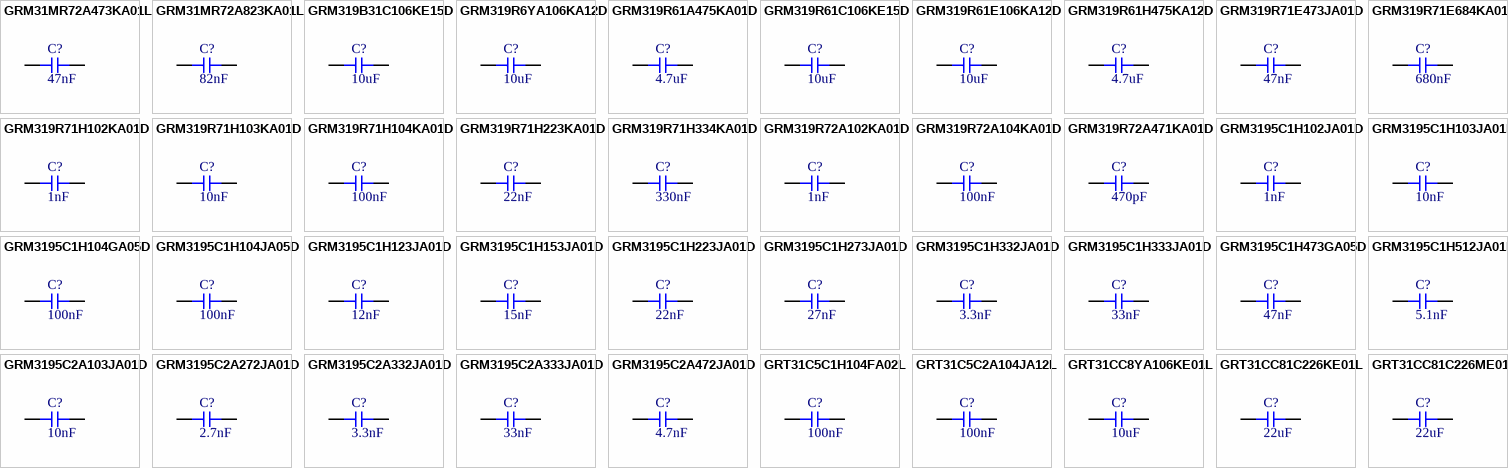
[diagram p50: symbols GRM31MR72A473KA01L to GRT31CC81C226ME01L]

## GRM31MR72A473KA01L
designator C?  Capacitance: 47nF  (hidden comment: *)
Capacitor, Ceramic (MLCC), 47nF, ±10%, 100V, X7R, ±10%, SMD 1206; Manufacturer: Murata Electronics; Manufacturer Part Number: GRM31MR72A473KA01L; Package Size: 1206; JLCPCB Basic Part: No; JLCPCB Part Number: C469552; Supplier 1: LCSC; Category: Capacitors - MLCC; Supplier Part Number 1: C469552; Tolerance: ±10%; Voltage Rating: 100V; Temperature Coefficient: X7R; RoHS: Yes; ComponentLink1Description: Datasheet; ComponentLink1URL: https://wmsc.lcsc.com/wmsc/upload/file/pdf/v2/lcsc/1912241611_Murata-Electronics-GRM31MR72A473KA01L_C469552.pdf; ComponentLink2Description: JLCPCB Part URL; ComponentLink2URL: https://jlcpcb.com/partdetail/C469552; ComponentLink3Description: LCSC Part URL; ComponentLink3URL: https://lcsc.com/product-detail/Multilayer-Ceramic-Capacitors-MLCC---SMD-SMT_Murata-Electronics-Murata-Electronics-GRM31MR72A473KA01L_C469552.html
footprint CAP-1206 (1206 (3216M) Capacitor)
pins: 1, 2

## GRM31MR72A823KA01L
designator C?  Capacitance: 82nF  (hidden comment: *)
Capacitor, Ceramic (MLCC), 82nF, ±10%, 100V, X7R, ±10%, SMD 1206; Manufacturer: Murata Electronics; Manufacturer Part Number: GRM31MR72A823KA01L; Package Size: 1206; JLCPCB Basic Part: No; JLCPCB Part Number: C162502; Supplier 1: LCSC; Category: Capacitors - MLCC; Supplier Part Number 1: C162502; Tolerance: ±10%; Voltage Rating: 100V; Temperature Coefficient: X7R; RoHS: Yes; ComponentLink1Description: Datasheet; ComponentLink1URL: https://wmsc.lcsc.com/wmsc/upload/file/pdf/v2/lcsc/2304140030_Murata-Electronics-GRM31MR72A823KA01L_C162502.pdf; ComponentLink2Description: JLCPCB Part URL; ComponentLink2URL: https://jlcpcb.com/partdetail/C162502; ComponentLink3Description: LCSC Part URL; ComponentLink3URL: https://lcsc.com/product-detail/Multilayer-Ceramic-Capacitors-MLCC---SMD-SMT_Murata-Electronics-Murata-Electronics-GRM31MR72A823KA01L_C162502.html
footprint CAP-1206 (1206 (3216M) Capacitor)
pins: 1, 2

## GRM319B31C106KE15D
designator C?  Capacitance: 10uF  (hidden comment: *)
Capacitor, Ceramic (MLCC), 10uF, ±10%, ±10%, SMD 1206; Manufacturer: Murata Electronics; Manufacturer Part Number: GRM319B31C106KE15D; Package Size: 1206; JLCPCB Basic Part: No; JLCPCB Part Number: C913644; Supplier 1: LCSC; Category: Capacitors - MLCC; Supplier Part Number 1: C913644; Tolerance: ±10%; RoHS: Yes; ComponentLink1Description: Datasheet; ComponentLink1URL: https://wmsc.lcsc.com/wmsc/upload/file/pdf/v2/lcsc/2201131300_Murata-Electronics-GRM319B31C106KE15D_C913644.pdf; ComponentLink2Description: JLCPCB Part URL; ComponentLink2URL: https://jlcpcb.com/partdetail/C913644; ComponentLink3Description: LCSC Part URL; ComponentLink3URL: https://lcsc.com/product-detail/Multilayer-Ceramic-Capacitors-MLCC---SMD-SMT_Murata-Electronics-Murata-Electronics-GRM319B31C106KE15D_C913644.html
footprint CAP-1206 (1206 (3216M) Capacitor)
pins: 1, 2

## GRM319R6YA106KA12D
designator C?  Capacitance: 10uF  (hidden comment: *)
Capacitor, Ceramic (MLCC), 10uF, ±10%, 35V, X5R, ±10%, SMD 1206; Manufacturer: Murata Electronics; Manufacturer Part Number: GRM319R6YA106KA12D; Package Size: 1206; JLCPCB Basic Part: No; JLCPCB Part Number: C123678; Supplier 1: LCSC; Category: Capacitors - MLCC; Supplier Part Number 1: C123678; Tolerance: ±10%; Voltage Rating: 35V; Temperature Coefficient: X5R; RoHS: Yes; ComponentLink1Description: Datasheet; ComponentLink1URL: https://wmsc.lcsc.com/wmsc/upload/file/pdf/v2/lcsc/2001180203_Murata-Electronics-GRM319R6YA106KA12D_C123678.pdf; ComponentLink2Description: JLCPCB Part URL; ComponentLink2URL: https://jlcpcb.com/partdetail/C123678; ComponentLink3Description: LCSC Part URL; ComponentLink3URL: https://lcsc.com/product-detail/Multilayer-Ceramic-Capacitors-MLCC---SMD-SMT_Murata-Electronics-Murata-Electronics-GRM319R6YA106KA12D_C123678.html
footprint CAP-1206 (1206 (3216M) Capacitor)
pins: 1, 2

## GRM319R61A475KA01D
designator C?  Capacitance: 4.7uF  (hidden comment: *)
Capacitor, Ceramic (MLCC), 4.7uF, ±10%, 10V, X5R, ±10%, SMD 1206; Manufacturer: Murata Electronics; Manufacturer Part Number: GRM319R61A475KA01D; Package Size: 1206; JLCPCB Basic Part: No; JLCPCB Part Number: C408146; Supplier 1: LCSC; Category: Capacitors - MLCC; Supplier Part Number 1: C408146; Tolerance: ±10%; Voltage Rating: 10V; Temperature Coefficient: X5R; RoHS: Yes; ComponentLink1Description: Datasheet; ComponentLink1URL: https://wmsc.lcsc.com/wmsc/upload/file/pdf/v2/lcsc/2304140030_Murata-Electronics-GRM319R61A475KA01D_C408146.pdf; ComponentLink2Description: JLCPCB Part URL; ComponentLink2URL: https://jlcpcb.com/partdetail/C408146; ComponentLink3Description: LCSC Part URL; ComponentLink3URL: https://lcsc.com/product-detail/Multilayer-Ceramic-Capacitors-MLCC---SMD-SMT_Murata-Electronics-Murata-Electronics-GRM319R61A475KA01D_C408146.html
footprint CAP-1206 (1206 (3216M) Capacitor)
pins: 1, 2

## GRM319R61C106KE15D
designator C?  Capacitance: 10uF  (hidden comment: *)
Capacitor, Ceramic (MLCC), 10uF, ±10%, 16V, X5R, ±10%, SMD 1206; Manufacturer: Murata Electronics; Manufacturer Part Number: GRM319R61C106KE15D; Package Size: 1206; JLCPCB Basic Part: No; JLCPCB Part Number: C86046; Supplier 1: LCSC; Category: Capacitors - MLCC; Supplier Part Number 1: C86046; Tolerance: ±10%; Voltage Rating: 16V; Temperature Coefficient: X5R; RoHS: Yes; ComponentLink1Description: Datasheet; ComponentLink1URL: https://wmsc.lcsc.com/wmsc/upload/file/pdf/v2/lcsc/2304140030_Murata-Electronics-GRM319R61C106KE15D_C86046.pdf; ComponentLink2Description: JLCPCB Part URL; ComponentLink2URL: https://jlcpcb.com/partdetail/C86046; ComponentLink3Description: LCSC Part URL; ComponentLink3URL: https://lcsc.com/product-detail/Multilayer-Ceramic-Capacitors-MLCC---SMD-SMT_Murata-Electronics-Murata-Electronics-GRM319R61C106KE15D_C86046.html
footprint CAP-1206 (1206 (3216M) Capacitor)
pins: 1, 2

## GRM319R61E106KA12D
designator C?  Capacitance: 10uF  (hidden comment: *)
Capacitor, Ceramic (MLCC), 10uF, ±10%, 25V, X5R, ±10%, SMD 1206; Manufacturer: Murata Electronics; Manufacturer Part Number: GRM319R61E106KA12D; Package Size: 1206; JLCPCB Basic Part: No; JLCPCB Part Number: C162437; Supplier 1: LCSC; Category: Capacitors - MLCC; Supplier Part Number 1: C162437; Tolerance: ±10%; Voltage Rating: 25V; Temperature Coefficient: X5R; RoHS: Yes; ComponentLink1Description: Datasheet; ComponentLink1URL: https://wmsc.lcsc.com/wmsc/upload/file/pdf/v2/lcsc/1912111437_Murata-Electronics-GRM319R61E106KA12D_C162437.pdf; ComponentLink2Description: JLCPCB Part URL; ComponentLink2URL: https://jlcpcb.com/partdetail/C162437; ComponentLink3Description: LCSC Part URL; ComponentLink3URL: https://lcsc.com/product-detail/Multilayer-Ceramic-Capacitors-MLCC---SMD-SMT_Murata-Electronics-Murata-Electronics-GRM319R61E106KA12D_C162437.html
footprint CAP-1206 (1206 (3216M) Capacitor)
pins: 1, 2

## GRM319R61H475KA12D
designator C?  Capacitance: 4.7uF  (hidden comment: *)
Capacitor, Ceramic (MLCC), 4.7uF, ±10%, 50V, X5R, ±10%, SMD 1206; Manufacturer: Murata Electronics; Manufacturer Part Number: GRM319R61H475KA12D; Package Size: 1206; JLCPCB Basic Part: No; JLCPCB Part Number: C415529; Supplier 1: LCSC; Category: Capacitors - MLCC; Supplier Part Number 1: C415529; Tolerance: ±10%; Voltage Rating: 50V; Temperature Coefficient: X5R; RoHS: Yes; ComponentLink1Description: Datasheet; ComponentLink1URL: https://wmsc.lcsc.com/wmsc/upload/file/pdf/v2/lcsc/2304140030_Murata-Electronics-GRM319R61H475KA12D_C415529.pdf; ComponentLink2Description: JLCPCB Part URL; ComponentLink2URL: https://jlcpcb.com/partdetail/C415529; ComponentLink3Description: LCSC Part URL; ComponentLink3URL: https://lcsc.com/product-detail/Multilayer-Ceramic-Capacitors-MLCC---SMD-SMT_Murata-Electronics-Murata-Electronics-GRM319R61H475KA12D_C415529.html
footprint CAP-1206 (1206 (3216M) Capacitor)
pins: 1, 2

## GRM319R71E473JA01D
designator C?  Capacitance: 47nF  (hidden comment: *)
Capacitor, Ceramic (MLCC), 47nF, ±5%, 25V, X7R, ±5%, SMD 1206; Manufacturer: Murata Electronics; Manufacturer Part Number: GRM319R71E473JA01D; Package Size: 1206; JLCPCB Basic Part: No; JLCPCB Part Number: C408148; Supplier 1: LCSC; Category: Capacitors - MLCC; Supplier Part Number 1: C408148; Tolerance: ±5%; Voltage Rating: 25V; Temperature Coefficient: X7R; RoHS: Yes; ComponentLink1Description: Datasheet; ComponentLink1URL: https://wmsc.lcsc.com/wmsc/upload/file/pdf/v2/lcsc/2304140030_Murata-Electronics-GRM319R71E473JA01D_C408148.pdf; ComponentLink2Description: JLCPCB Part URL; ComponentLink2URL: https://jlcpcb.com/partdetail/C408148; ComponentLink3Description: LCSC Part URL; ComponentLink3URL: https://lcsc.com/product-detail/Multilayer-Ceramic-Capacitors-MLCC---SMD-SMT_Murata-Electronics-Murata-Electronics-GRM319R71E473JA01D_C408148.html
footprint CAP-1206 (1206 (3216M) Capacitor)
pins: 1, 2